# Altium footprint library Lib.PcbLib: 52 footprints (part 2 of 4)
Each footprint in its own frame and in the unit in brackets; x right, y up, seen from the top. Pads: shape width x height; smd on the part's side, far side on the other; paste and mask are expansions set on the pad; w line width, h text height; cw(c..) or ccw(c..) is an arc to the next point about the centre after c.
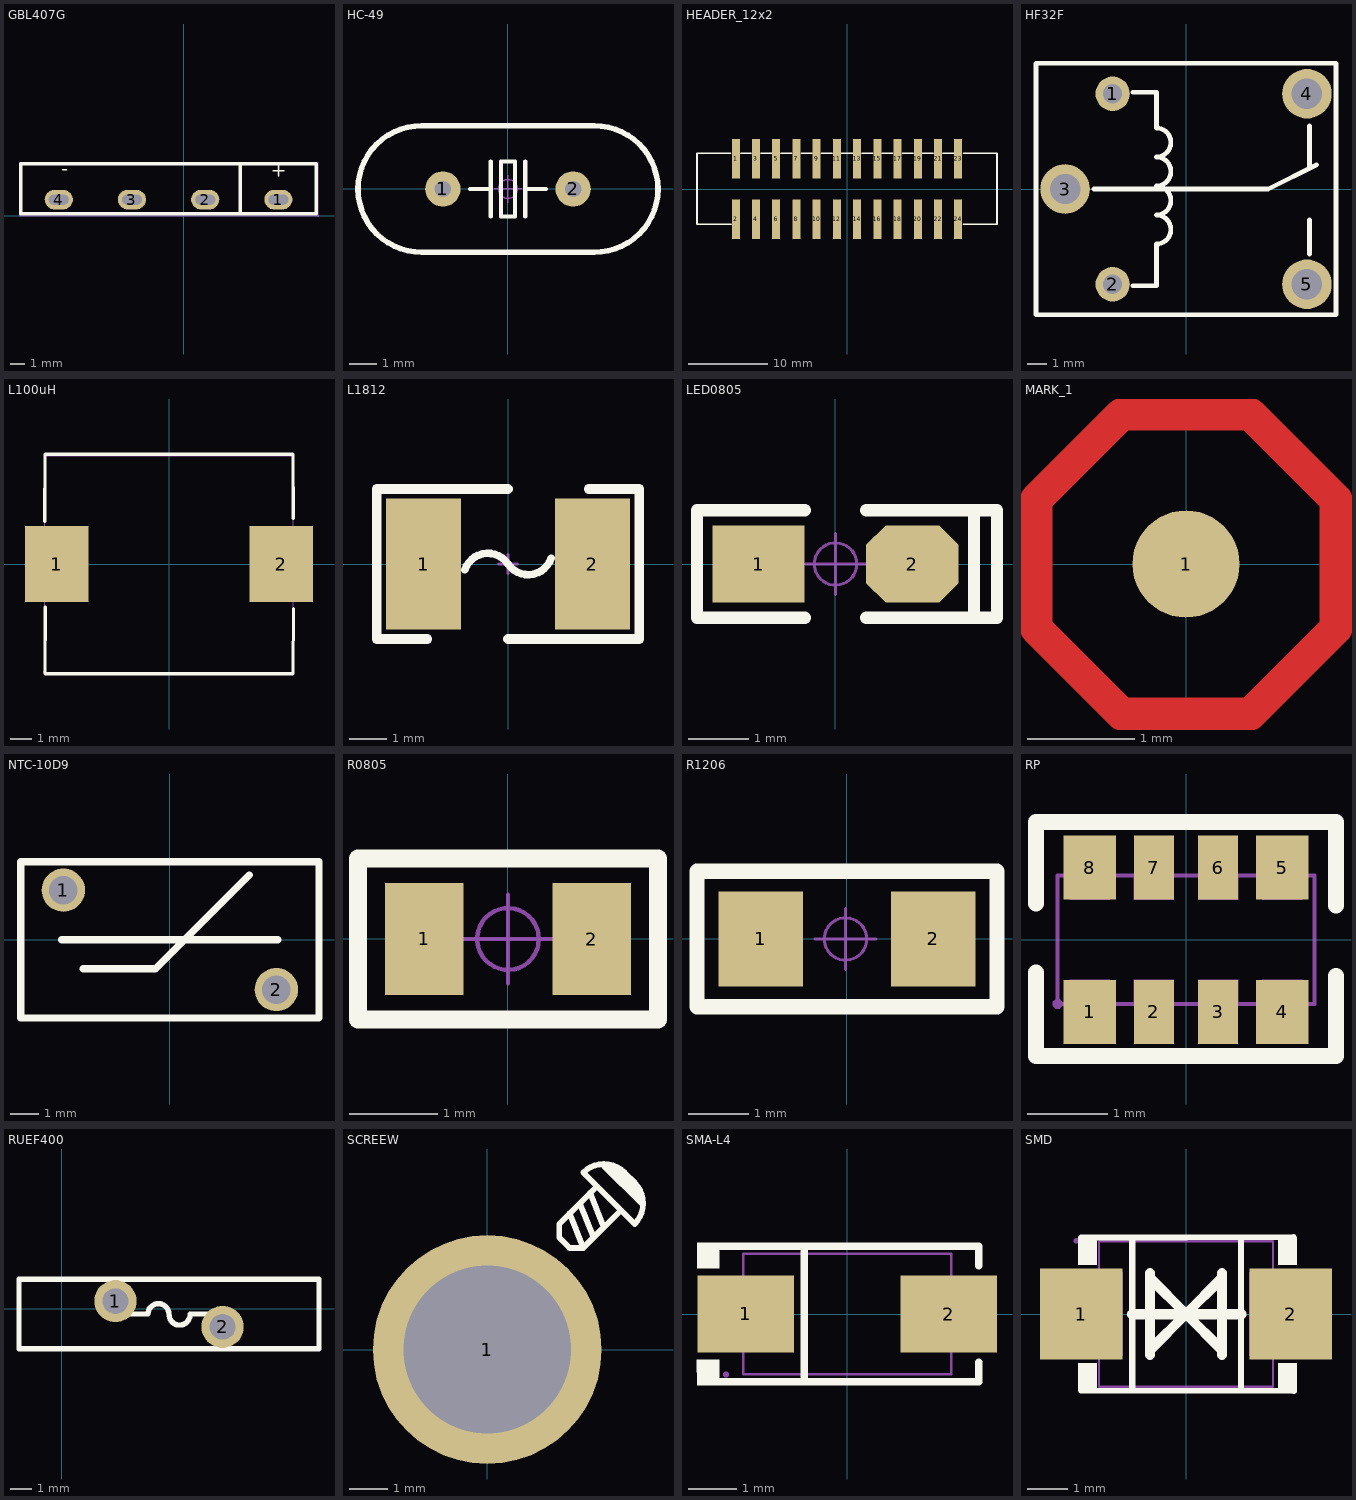
[diagram p1: the footprints below, top view; thin cyan lines are the x and y axes]

## GBL407G [mil]
pads (4):
  oval 78.74x55.12 hole 27.56 slot 55.12 at 0 deg: 1(264.55,45) 4(-349.67,45)
  oval 78.74x55.12 hole 27.56 slot 55.12 at 0 deg copper offset -0.04,0: 2(59.88,45)
  oval 78.74x55.12 hole 27.56 slot 55.12 at 0 deg copper offset 0.04,0: 3(-145,45)
Top Overlay:
  lines w10: 157.42,5 157.42,145 ; -455.95,5 370.82,5 370.82,145 -455.95,145 -455.95,5
  text "+" at 287.44,109.08 h38.61
  text "-" at -322.56,113.28 h38.61
Mechanical 15:
  region: 373.46,0 373.46,0.98 374.84,2.36 376.8,2.36 378.18,0.98 378.18,0 378.18,-0.98 376.8,-2.36 374.84,-2.36 373.46,-0.98
  region: 278.31,56.02 250.75,56.02 250.75,33.98 278.31,33.98
  region: 73.58,56.02 46.02,56.02 46.02,33.98 73.58,33.98
  region: -131.14,56.02 -158.7,56.02 -158.7,33.98 -131.14,33.98
  region: -335.87,56.02 -363.43,56.02 -363.43,33.98 -335.87,33.98
  lines w2: -460.95,0 -460.95,150 375.82,150 375.82,0 -460.95,0
3D body "GBU.STEP": height 818.9, standoff -157.48, extent -473.07,-7.8 393.07,130

## HC-49 [mm]
pads (2):
  round 1.3 hole 0.6: 1(-2.4,0) 2(2.4,0)
Top Overlay:
  lines w0.152: -1.397,0 -0.635,0 ; -0.635,-1.016 -0.635,1.016 ; 0.635,-1.016 0.635,1.016 ; 0.635,0 1.397,0 ; -0.254,-1.016 -0.254,1.016 0.254,1.016 0.254,-1.016 -0.254,-1.016
  lines w0.203: -3.175,2.325 ccw(c-3.2,0) -3.173,-2.325 3.175,-2.325 ccw(c3.2,0) 3.173,2.325 -3.175,2.325
Mechanical 15:
  circle w0.05: c0,0 r0.35
  lines w0.05: -0.5,0 0.5,0 ; 0,-0.5 0,0.5
3D body "OSC HC-49S.STEP": height 4.13, standoff -3.45, extent -5.525,-2.325 5.525,2.325

## HEADER_12x2 [mm]
pads (24):
  rect 1x5 smd: 1(-13.97,3.81) 2(-13.97,-3.81) 3(-11.43,3.81) 4(-11.43,-3.81) 5(-8.89,3.81) 6(-8.89,-3.81) 7(-6.35,3.81) 8(-6.35,-3.81) 9(-3.81,3.81) 10(-3.81,-3.81) 11(-1.27,3.81) 12(-1.27,-3.81) 13(1.27,3.81) 14(1.27,-3.81) 15(3.81,3.81) 16(3.81,-3.81) 17(6.35,3.81) 18(6.35,-3.81) 19(8.89,3.81) 20(8.89,-3.81) 21(11.43,3.81) 22(11.43,-3.81) 23(13.97,3.81) 24(13.97,-3.81)
Top Overlay:
  lines w0.203: -14.58,4.49 -18.84,4.49 -18.84,-4.41 -14.554,-4.41 ; -13.36,4.496 -12.014,4.496 ; -10.846,4.496 -9.474,4.496 ; -8.306,4.496 -6.934,4.496 ; -5.766,4.496 -4.394,4.496 ; -3.226,4.496 -1.854,4.496 ; -0.686,4.496 0.686,4.496 ; 1.854,4.496 3.226,4.496 ; 4.394,4.496 5.766,4.496 ; 6.934,4.496 8.306,4.496 ; 9.474,4.496 10.846,4.496 ; 12.014,4.496 13.386,4.496 ; 14.58,-4.41 18.84,-4.41 18.84,4.49 14.58,4.49
3D body "简牛贴片24.STEP": height 10, standoff 0, extent -18.865,-5.694 18.815,5.746

## HF32F [mm]
pads (5):
  round 1.8 hole 1: 1(-3.85,5) 2(-3.85,-5)
  round 2.6 hole 1.6: 3(-6.35,0) 4(6.35,5) 5(6.35,-5)
Top Overlay:
  lines w0.254: -4.826,0 4.318,0 6.858,1.27 ; -2.794,-5.08 -1.556,-5.08 -1.556,-2.89 ccw(c-1.556,-2.128) -1.556,-1.366 ccw(c-1.556,-0.604) -1.556,0.158 ccw(c-1.556,0.92) -1.556,1.682 ccw(c-1.556,2.444) -1.556,3.206 -1.556,5.08 -2.794,5.08 ; 6.477,-3.429 6.488,-1.62 ; 6.488,1.174 6.488,3.302 ; -7.874,-6.604 -7.874,6.604 7.874,6.604 7.874,-6.604 -7.874,-6.604
3D body "012-1ZW_BK.STEP": height 12.9, standoff -3.6, extent -7.85,-6.1 7.65,6.1

## L100uH [mm]
pads (2):
  rect 2.924x3.5 smd: 1(-5.18,0) 2(5.18,0)
Top Overlay:
  lines w0.152: -5.74,1.981 -5.726,5.076 5.726,5.076 5.736,2.102 ; -5.713,-1.993 -5.726,-5.076 5.726,-5.076 5.754,-2.054
Mechanical 15:
  region: 5.75,-1.5 3.75,-1.5 3.75,1.5 5.75,1.5
  region: -3.75,-1.5 -5.75,-1.5 -5.75,1.5 -3.75,1.5
  region: -5.69,-5 -5.691,-4.976 -5.726,-4.942 -5.774,-4.942 -5.809,-4.976 -5.81,-5 -5.809,-5.024 -5.774,-5.058 -5.726,-5.058 -5.691,-5.024
  lines w0.051: -5.75,-5 5.75,-5 5.75,5 -5.75,5 -5.75,-5

## L1812 [mm]
pads (2):
  rect 2x3.5 smd: 1(-2.25,0) 2(2.25,0)
Top Overlay:
  lines w0.203: -1.15,-0.156 cw(c-0.537,-0.362) 0,0 ccw(c0.537,0.362) 1.15,0.156
  lines w0.254: -2.159,-2 -3.5,-2 -3.5,2 0,2 ; 0,-2 3.5,-2 3.5,2 2.159,2
Mechanical 15:
  lines w0.076: -0.254,0 0.254,0 ; 0,-0.254 0,0.254
3D body "FU 01812.STEP": height 0.87, standoff 0, extent -2.3,-1.61 2.3,1.61

## LED0805 [mil]
pads (2):
  rect 60x50 smd: 1(-50,0)
  oct 60x50 smd: 2(50,0)
Top Overlay:
  lines w8: -20,-35 -90,-35 -90,35 -20,35 ; 20,-35 105,-35 105,35 20,35 ; 90,-35 90,35
Mechanical 15:
  circle w1.97: c0,0 r13.78
  lines w1.97: -19.68,0 19.69,0 ; 0,-19.68 0,19.68
3D body "LED 0805玻璃罩.ST": height 31.69, standoff 12.01, extent -29.49,-24.65 29.49,24.65
3D body "LED 0805-Y.STEP": height 26.33, standoff -0.16, extent -39.37,-24.65 39.37,24.65

## MARK_1 [mm]
height 1.2
pads (1):
  round 1.001 smd: 1(0,0)
Top Layer:
  lines w0.305: -1.4,-0.599 -0.599,-1.4 0.599,-1.4 1.4,-0.599 1.4,0.599 0.599,1.4 -0.599,1.4 -1.4,0.599 -1.4,-0.599

## NTC-10D9 [mil]
pads (2):
  round 60 hole 39.37: 1(-147.6,68.9) 2(147.6,-68.9)
Top Overlay:
  lines w10: -150,0 150,0 ; -120,-40 -20,-40 110,90 ; -206.69,-108.27 206.69,-108.27 206.69,108.27 -206.69,108.27 -206.69,-108.27
Mechanical 15:
  region: 159.41,-68.9 159.41,-66.55 157.61,-62.21 154.29,-58.88 149.95,-57.09 145.25,-57.09 140.91,-58.88 137.58,-62.21 135.79,-66.55 135.79,-68.9 135.79,-71.25 137.58,-75.59 140.91,-78.91 145.25,-80.71 149.95,-80.71 154.29,-78.91 157.61,-75.59 159.41,-71.25
  region: -135.79,68.9 -135.79,71.25 -137.59,75.59 -140.91,78.92 -145.25,80.71 -149.95,80.71 -154.29,78.92 -157.62,75.59 -159.41,71.25 -159.41,68.9 -159.41,66.55 -157.62,62.21 -154.29,58.89 -149.95,57.09 -145.25,57.09 -140.91,58.89 -137.59,62.21 -135.79,66.55
  region: -204.33,108.27 -204.33,109.25 -205.71,110.63 -207.67,110.63 -209.05,109.25 -209.05,108.27 -209.05,107.29 -207.67,105.91 -205.72,105.91 -204.33,107.29
  lines w2: -206.69,-108.27 206.69,-108.27 206.69,108.27 -206.69,108.27 -206.69,-108.27
3D body "User Library-MOV 14mm.step": height 807.26, standoff -78.74, extent -337.02,-129 331.98,119

## R0805 [mm]
pads (2):
  rect 0.889x1.27 smd: 1(-0.95,0) 2(0.95,0)
Top Overlay:
  lines w0.203: -1.7,-0.914 1.7,-0.914 1.7,0.914 -1.7,0.914 -1.7,-0.914
Mechanical 15:
  circle w0.05: c0,0 r0.35
  lines w0.05: -0.5,0 0.5,0 ; 0,-0.5 0,0.5
3D body "R 0805.STEP": height 0.5, standoff -0.01, extent -1,-0.625 1,0.625

## R1206 [mil]
pads (2):
  rect 55x62 smd: 1(-56.1,0) 2(56.1,0)
Top Overlay:
  lines w10: -97.44,-44 -97.44,44 97.44,44 97.44,-44 -97.44,-44
Mechanical 15:
  circle w1.97: c-0.98,0 r13.78
  lines w1.97: -20.67,0 18.7,0 ; -0.98,-19.68 -0.98,19.68
3D body "R 1206.STEP": height 21.69, standoff -0.24, extent -63.97,-31.49 62.01,31.5

## RP [mm]
pads (8):
  rect 0.65x0.8 smd: 1(-1.2,-0.9) 4(1.2,-0.9) 5(1.2,0.9) 8(-1.2,0.9)
  rect 0.5x0.8 smd: 2(-0.4,-0.9) 3(0.4,-0.9) 6(0.4,0.9) 7(-0.4,0.9)
Top Overlay:
  lines w0.2: -1.87,-0.41 -1.87,-1.45 1.87,-1.45 1.87,-0.45 ; -1.87,0.45 -1.87,1.47 1.87,1.47 1.87,0.43
Mechanical 15:
  region: -1.45,-0.8 -1.45,-0.5 -0.95,-0.5 -0.95,-0.8
  region: -1.45,0.5 -1.45,0.8 -0.95,0.8 -0.95,0.5
  region: -0.65,-0.8 -0.65,-0.5 -0.15,-0.5 -0.15,-0.8
  region: 0.15,-0.8 0.15,-0.5 0.65,-0.5 0.65,-0.8
  region: 0.15,0.5 0.15,0.8 0.65,0.8 0.65,0.5
  region: 0.95,-0.8 0.95,-0.5 1.45,-0.5 1.45,-0.8
  region: -0.65,0.5 -0.65,0.8 -0.15,0.8 -0.15,0.5
  region: 0.95,0.5 0.95,0.8 1.45,0.8 1.45,0.5
  region: -1.54,-0.8 -1.54,-0.775 -1.575,-0.74 -1.625,-0.74 -1.66,-0.775 -1.66,-0.8 -1.66,-0.825 -1.625,-0.86 -1.575,-0.86 -1.54,-0.825
  lines w0.051: -1.6,-0.8 -1.6,0.8 1.6,0.8 1.6,-0.8 -1.6,-0.8
3D body "RCA-8P4R-0603.STEP": height 0.6, standoff 0, extent -1.6,-0.8 1.6,0.8

## RUEF400 [mm]
pads (2):
  round 2 hole 1.2 slot 1.205 at 0 deg paste-2539.97 mask+0.051: 1(2.54,0.356) 2(7.62,-0.864)
Top Overlay:
  lines w0.254: 3.08,-0.254 4.08,-0.254 cw(c4.58,-0.265) 5.08,-0.254 ccw(c5.58,-0.277) 6.081,-0.254 ; 6.08,-0.254 7.08,-0.254 ; -2.032,-1.905 -2.032,1.397 12.192,1.397 12.192,-1.905 -2.032,-1.905
Mechanical 15:
  lines w0.003: 5.524,-0.127 5.525,-0.127
3D body "9D-4.5.STEP": height 10, standoff -3.5, extent 0.542,-1.644 9.539,1.356

## SCREEW [mm]
height 1.2
pads (1):
  round 6 hole 4.4: 1(0,0)
Top Overlay:
  lines w0.152: 2.159,3.565 2.518,2.667 ; 2.428,3.834 2.788,2.936 ; 2.698,4.104 3.057,3.206 ; 2.877,4.283 1.89,3.296 1.89,2.936 2.159,2.667 2.518,2.667 ; 3.057,4.822 4.045,3.834 ; 3.237,4.822 4.045,4.014 ; 3.506,3.655 2.518,2.667 ; 2.518,4.643 cw(c3.057,4.104) 3.596,4.643 3.865,4.373 cw(c3.326,3.834) 3.865,3.296 2.518,4.643

## SMA-L4 [mm]
pads (2):
  rect 2x1.593 smd: 1(-2.1,0) 2(2.1,0)
Top Overlay:
  region: -2.65,1.477 -2.65,0.949 -3.107,0.949 -3.107,1.477
  region: -2.65,-1.477 -2.65,-0.949 -3.107,-0.949 -3.107,-1.477
  lines w0.152: -2.726,-1.401 2.726,-1.401 2.726,-1 ; -2.726,1.401 2.726,1.401 2.726,1 ; -0.886,-1.401 -0.886,1.401
Mechanical 6:
  region: -2.451,-0.099 -2.451,0.099 -1.656,0.099 -1.656,-0.099
  region: 2.451,-0.099 2.451,0.099 1.656,0.099 1.656,-0.099
  region: 2.153,-0.663 2.153,0.663 1.954,0.663 1.954,-0.663
Mechanical 15:
  region: -1.307,0.725 -1.307,-0.725 -2.507,-0.725 -2.507,0.725
  region: 1.307,-0.725 1.307,0.725 2.507,0.725 2.507,-0.725
  region: -2.447,-1.25 -2.447,-1.225 -2.482,-1.19 -2.532,-1.19 -2.567,-1.225 -2.567,-1.25 -2.567,-1.275 -2.532,-1.31 -2.482,-1.31 -2.447,-1.275
  lines w0.051: -2.15,-1.25 -2.15,1.25 2.15,1.25 2.15,-1.25 -2.15,-1.25

## SMD [mm]
pads (2):
  rect 2.047x2.241 smd: 1(-2.591,0) 2(2.591,0)
Top Overlay:
  region: -2.667,-1.905 -2.667,-1.215 -2.21,-1.215 -2.21,-1.905
  region: -2.667,1.905 -2.667,1.215 -2.21,1.215 -2.21,1.905
  region: 2.286,1.905 2.286,1.215 2.743,1.215 2.743,1.905
  region: 2.286,-1.905 2.286,-1.215 2.743,-1.215 2.743,-1.905
  lines w0.152: -2.599,-1.89 2.667,-1.905 ; -2.591,1.887 2.663,1.905 ; -1.331,-1.886 -1.331,1.886 ; 1.364,-1.886 1.364,1.886
  lines w0.254: -1.331,-0.008 1.364,-0.008 ; 0,0 0.889,0.889 0.889,1.016 0.889,-1.016 0.889,-0.889 0,0 ; 0,0 -0.889,-0.889 -0.889,-1.016 -0.889,1.016 -0.889,0.889 0,0
Mechanical 15:
  region: -2.708,1.037 -2.708,-1.037 -1.568,-1.037 -1.568,1.037
  region: 2.708,1.037 2.708,-1.037 1.568,-1.037 1.568,1.037
  region: -2.659,1.816 -2.659,1.841 -2.694,1.876 -2.744,1.876 -2.779,1.841 -2.779,1.816 -2.779,1.791 -2.744,1.756 -2.694,1.756 -2.659,1.791
  lines w0.051: -2.15,-1.8 -2.15,1.8 2.15,1.8 2.15,-1.8 -2.15,-1.8